# Altium footprint library PHOENIX THD.PcbLib: 109 footprints (part 3 of 8)
Each footprint in its own frame and in the unit in brackets; x right, y up, seen from the top. Pads: shape width x height; smd on the part's side, far side on the other; paste and mask are expansions set on the pad; w line width, h text height; cw(c..) or ccw(c..) is an arc to the next point about the centre after c.
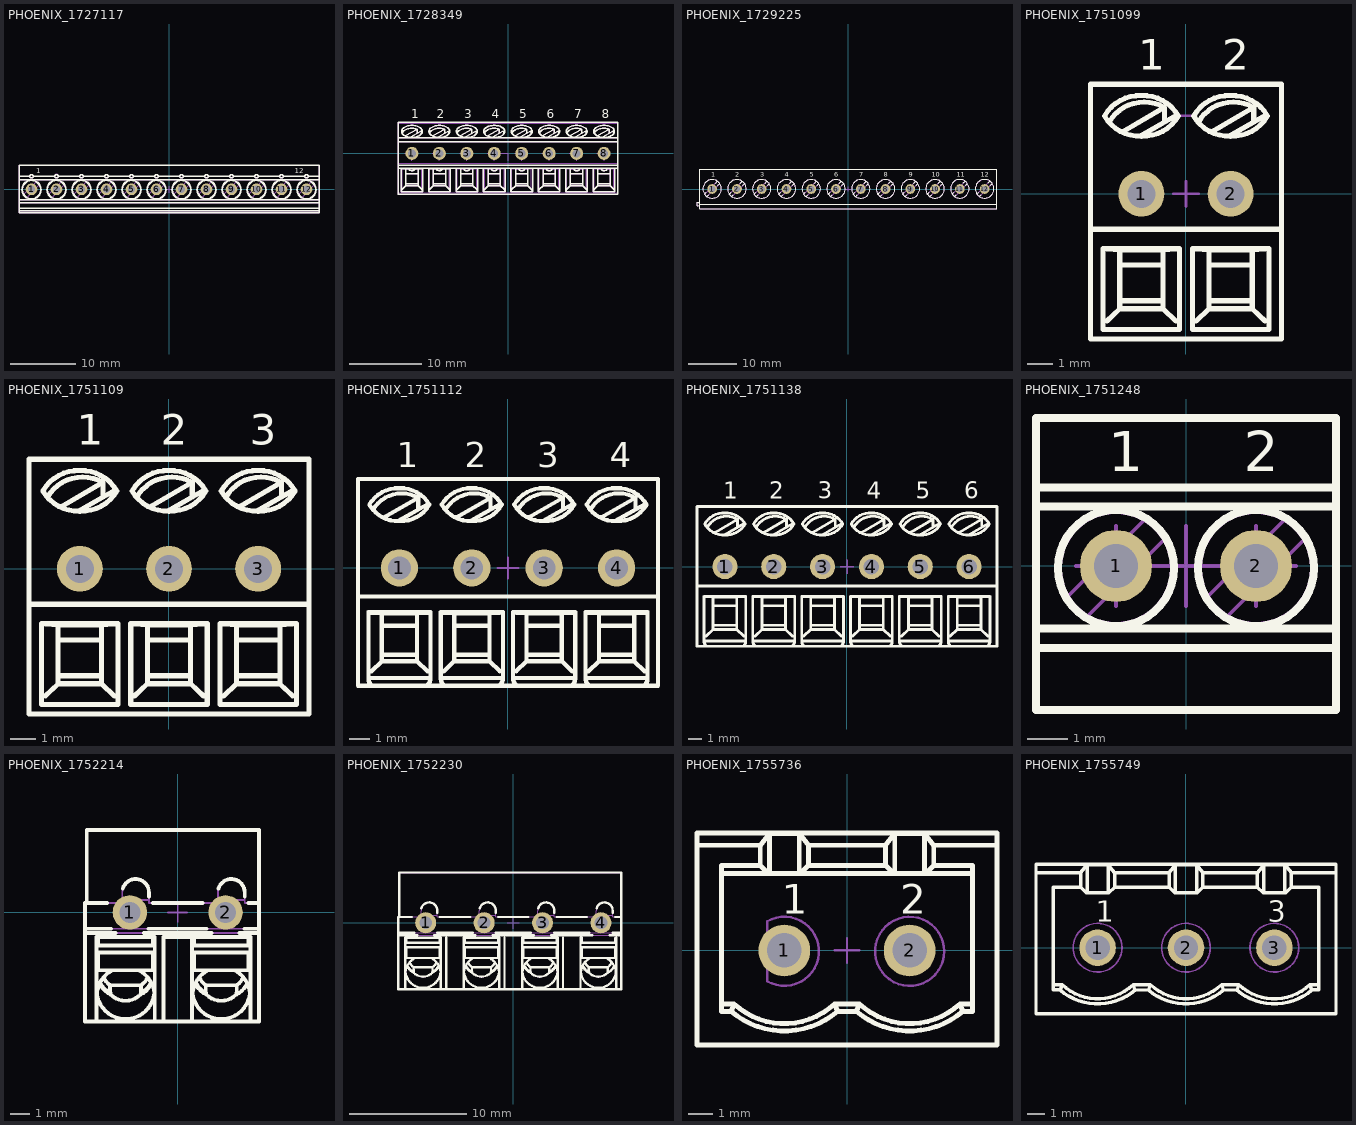
[diagram p2: the footprints below, top view; thin cyan lines are the x and y axes]

## PHOENIX_1727117 [mm] "PCB Terminal Block, Pitch 3.81mm, 12 Positions, Screw Connection"
height 8.5
pads (12):
  round 1.8 hole 1.1: 1(-20.955,0) 2(-17.145,0) 3(-13.335,0) 4(-9.525,0) 5(-5.715,0) 6(-1.905,0) 7(1.905,0) 8(5.715,0) 9(9.525,0) 10(13.335,0) 11(17.145,0) 12(20.955,0)
Top Overlay:
  circle w0.2: c-20.955,-0.05 r1.45
  circle w0.2: c-20.955,-0.05 r1.4
  circle w0.2: c-17.145,-0.05 r1.45
  circle w0.2: c-17.145,-0.05 r1.4
  circle w0.2: c-13.335,-0.05 r1.45
  circle w0.2: c-13.335,-0.05 r1.4
  circle w0.2: c-9.525,-0.05 r1.45
  circle w0.2: c-9.525,-0.05 r1.4
  circle w0.2: c-5.715,-0.05 r1.45
  circle w0.2: c-5.715,-0.05 r1.4
  circle w0.2: c-1.905,-0.05 r1.45
  circle w0.2: c-1.905,-0.05 r1.4
  circle w0.2: c1.905,-0.05 r1.45
  circle w0.2: c1.905,-0.05 r1.4
  circle w0.2: c5.715,-0.05 r1.45
  circle w0.2: c5.715,-0.05 r1.4
  circle w0.2: c9.525,-0.05 r1.45
  circle w0.2: c9.525,-0.05 r1.4
  circle w0.2: c13.335,-0.05 r1.45
  circle w0.2: c13.335,-0.05 r1.4
  circle w0.2: c17.145,-0.05 r1.45
  circle w0.2: c17.145,-0.05 r1.4
  circle w0.2: c20.955,-0.05 r1.45
  circle w0.2: c20.955,-0.05 r1.4
  lines w0.2: -22.86,-3.3 22.86,-3.3 ; -22.86,-2.861 22.86,-2.861 ; -22.86,-2.049 22.86,-2.049 ; -22.86,-1.566 22.86,-1.566 ; -22.86,1.487 22.86,1.487 ; -22.86,1.962 -21.254,1.962 ; -22.161,-0.761 -22.088,-0.688 ; -21.666,-1.256 -21.593,-1.183 ; -20.317,1.083 -20.244,1.156 ; -19.822,0.588 -19.749,0.661 ; -18.351,-0.761 -18.278,-0.688 ; -17.856,-1.256 -17.783,-1.183 ; -16.507,1.083 -16.434,1.156 ; -16.012,0.588 -15.939,0.661 ; -14.541,-0.761 -14.468,-0.688 ; -14.046,-1.256 -13.973,-1.183 ; -12.697,1.083 -12.624,1.156 ; -12.202,0.588 -12.129,0.661 ; -10.731,-0.761 -10.658,-0.688 ; -10.236,-1.256 -10.163,-1.183 ; -8.887,1.083 -8.814,1.156 ; -8.392,0.588 -8.319,0.661 ; -6.921,-0.761 -6.848,-0.688 ; -6.426,-1.256 -6.353,-1.183 ; -5.077,1.083 -5.004,1.156 ; -4.582,0.588 -4.509,0.661 ; -3.111,-0.761 -3.038,-0.688 ; -2.616,-1.256 -2.543,-1.183 ; -1.267,1.083 -1.194,1.156 ; -0.772,0.588 -0.699,0.661 ; 0.699,-0.761 0.772,-0.688 ; 1.194,-1.256 1.267,-1.183 ; 2.543,1.083 2.616,1.156 ; 3.038,0.588 3.111,0.661 ; 4.509,-0.761 4.582,-0.688 ; 5.004,-1.256 5.077,-1.183 ; 6.353,1.083 6.426,1.156 ; 6.848,0.588 6.921,0.661 ; 8.319,-0.761 8.392,-0.688 ; 8.814,-1.256 8.887,-1.183 ; 10.163,1.083 10.236,1.156 ; 10.658,0.588 10.731,0.661 ; 12.129,-0.761 12.202,-0.688 ; 12.624,-1.256 12.697,-1.183 ; 13.973,1.083 14.046,1.156 ; 14.468,0.588 14.541,0.661 ; 15.939,-0.761 16.012,-0.688 ; 16.434,-1.256 16.507,-1.183 ; 17.783,1.083 17.856,1.156 ; 18.278,0.588 18.351,0.661 ; 19.749,-0.761 19.822,-0.688 ; 20.244,-1.256 20.317,-1.183 ; 21.593,1.083 21.666,1.156 ; 22.088,0.588 22.161,0.661 ; 22.86,1.962 21.254,1.962 ; -21.254,1.962 ccw(c-20.955,2.065) -20.656,1.962 ; -21.254,1.962 cw(c-20.955,1.951) -20.656,1.962 ; -20.656,1.962 -17.444,1.962 ; -17.444,1.962 ccw(c-17.145,2.065) -16.846,1.962 ; -17.444,1.962 cw(c-17.145,1.951) -16.846,1.962 ; -16.846,1.962 -13.634,1.962 ; -13.634,1.962 ccw(c-13.335,2.065) -13.036,1.962 ; -13.634,1.962 cw(c-13.335,1.951) -13.036,1.962 ; -13.036,1.962 -9.824,1.962 ; -9.824,1.962 ccw(c-9.525,2.065) -9.226,1.962 ; -9.824,1.962 cw(c-9.525,1.951) -9.226,1.962 ; -9.226,1.962 -6.014,1.962 ; -6.014,1.962 ccw(c-5.715,2.065) -5.416,1.962 ; -6.014,1.962 cw(c-5.715,1.951) -5.416,1.962 ; -5.416,1.962 -2.204,1.962 ; -2.204,1.962 ccw(c-1.905,2.065) -1.606,1.962 ; -2.204,1.962 cw(c-1.905,1.951) -1.606,1.962 ; -1.606,1.962 1.606,1.962 ; 1.606,1.962 ccw(c1.905,2.065) 2.204,1.962 ; 1.606,1.962 cw(c1.905,1.951) 2.204,1.962 ; 2.204,1.962 5.416,1.962 ; 5.416,1.962 ccw(c5.715,2.065) 6.014,1.962 ; 5.416,1.962 cw(c5.715,1.951) 6.014,1.962 ; 6.014,1.962 9.226,1.962 ; 9.226,1.962 ccw(c9.525,2.065) 9.824,1.962 ; 9.226,1.962 cw(c9.525,1.951) 9.824,1.962 ; 9.824,1.962 13.036,1.962 ; 13.036,1.962 ccw(c13.335,2.065) 13.634,1.962 ; 13.036,1.962 cw(c13.335,1.951) 13.634,1.962 ; 13.634,1.962 16.846,1.962 ; 16.846,1.962 ccw(c17.145,2.065) 17.444,1.962 ; 16.846,1.962 cw(c17.145,1.951) 17.444,1.962 ; 17.444,1.962 20.656,1.962 ; 20.656,1.962 ccw(c20.955,2.065) 21.254,1.962 ; 20.656,1.962 cw(c20.955,1.951) 21.254,1.962 ; -22.86,-3.6 22.86,-3.6 22.86,3.7 -22.86,3.7 -22.86,-3.6
  text "1" at -20.215,2.425 h0.8
  text "12" at 19.195,2.45 h0.8
Mechanical 8:
  lines w0.1: -21.455,0 -20.955,0 ; -20.955,-0.5 -20.955,0 ; -20.955,0.5 -20.955,0 ; -20.455,0 -20.955,0 ; -17.645,0 -17.145,0 ; -17.145,-0.5 -17.145,0 ; -17.145,0.5 -17.145,0 ; -16.645,0 -17.145,0 ; -13.835,0 -13.335,0 ; -13.335,-0.5 -13.335,0 ; -13.335,0.5 -13.335,0 ; -12.835,0 -13.335,0 ; -10.025,0 -9.525,0 ; -9.525,-0.5 -9.525,0 ; -9.525,0.5 -9.525,0 ; -9.025,0 -9.525,0 ; -6.215,0 -5.715,0 ; -5.715,-0.5 -5.715,0 ; -5.715,0.5 -5.715,0 ; -5.215,0 -5.715,0 ; -2.405,0 -1.905,0 ; -1.905,-0.5 -1.905,0 ; -1.905,0.5 -1.905,0 ; -1.405,0 -1.905,0 ; -0.5,0 0,0 ; 0,-0.5 0,0 ; 0,0.5 0,0 ; 0.5,0 0,0 ; 1.405,0 1.905,0 ; 1.905,-0.5 1.905,0 ; 1.905,0.5 1.905,0 ; 2.405,0 1.905,0 ; 5.215,0 5.715,0 ; 5.715,-0.5 5.715,0 ; 5.715,0.5 5.715,0 ; 6.215,0 5.715,0 ; 9.025,0 9.525,0 ; 9.525,-0.5 9.525,0 ; 9.525,0.5 9.525,0 ; 10.025,0 9.525,0 ; 12.835,0 13.335,0 ; 13.335,-0.5 13.335,0 ; 13.335,0.5 13.335,0 ; 13.835,0 13.335,0 ; 16.645,0 17.145,0 ; 17.145,-0.5 17.145,0 ; 17.145,0.5 17.145,0 ; 17.645,0 17.145,0 ; 20.455,0 20.955,0 ; 20.955,-0.5 20.955,0 ; 20.955,0.5 20.955,0 ; 21.455,0 20.955,0
Mechanical 14:
  circle w0.1: c-20.955,-0.05 r1.45
  circle w0.1: c-20.955,-0.05 r1.4
  circle w0.1: c-17.145,-0.05 r1.45
  circle w0.1: c-17.145,-0.05 r1.4
  circle w0.1: c-13.335,-0.05 r1.45
  circle w0.1: c-13.335,-0.05 r1.4
  circle w0.1: c-9.525,-0.05 r1.45
  circle w0.1: c-9.525,-0.05 r1.4
  circle w0.1: c-5.715,-0.05 r1.45
  circle w0.1: c-5.715,-0.05 r1.4
  circle w0.1: c-1.905,-0.05 r1.45
  circle w0.1: c-1.905,-0.05 r1.4
  circle w0.1: c1.905,-0.05 r1.45
  circle w0.1: c1.905,-0.05 r1.4
  circle w0.1: c5.715,-0.05 r1.45
  circle w0.1: c5.715,-0.05 r1.4
  circle w0.1: c9.525,-0.05 r1.45
  circle w0.1: c9.525,-0.05 r1.4
  circle w0.1: c13.335,-0.05 r1.45
  circle w0.1: c13.335,-0.05 r1.4
  circle w0.1: c17.145,-0.05 r1.45
  circle w0.1: c17.145,-0.05 r1.4
  circle w0.1: c20.955,-0.05 r1.45
  circle w0.1: c20.955,-0.05 r1.4
  lines w0.1: -22.86,-3.3 22.86,-3.3 ; -22.86,-2.861 22.86,-2.861 ; -22.86,-2.049 22.86,-2.049 ; -22.86,-1.566 22.86,-1.566 ; -22.86,1.487 22.86,1.487 ; -22.86,1.962 -21.254,1.962 ; -22.161,-0.761 -20.244,1.156 ; -21.666,-1.256 -19.749,0.661 ; -20.656,2.012 -17.444,2.012 cw(c-17.145,2.001) -16.846,2.012 -13.634,2.012 ; -18.351,-0.761 -16.434,1.156 ; -17.856,-1.256 -15.939,0.661 ; -14.541,-0.761 -12.624,1.156 ; -14.046,-1.256 -12.129,0.661 ; -10.731,-0.761 -8.814,1.156 ; -10.236,-1.256 -8.319,0.661 ; -6.921,-0.761 -5.004,1.156 ; -6.426,-1.256 -4.509,0.661 ; -3.111,-0.761 -1.194,1.156 ; -2.616,-1.256 -0.699,0.661 ; 0.699,-0.761 2.616,1.156 ; 1.194,-1.256 3.111,0.661 ; 4.509,-0.761 6.426,1.156 ; 5.004,-1.256 6.921,0.661 ; 8.319,-0.761 10.236,1.156 ; 8.814,-1.256 10.731,0.661 ; 12.129,-0.761 14.046,1.156 ; 12.624,-1.256 14.541,0.661 ; 15.939,-0.761 17.856,1.156 ; 16.434,-1.256 18.351,0.661 ; 19.749,-0.761 21.666,1.156 ; 20.244,-1.256 22.161,0.661 ; 22.86,1.962 21.254,1.962 ; -21.254,1.962 ccw(c-20.955,2.065) -20.656,1.962 ; -21.254,1.962 cw(c-20.955,1.951) -20.656,1.962 ; -20.656,1.962 -17.444,1.962 ; -17.444,1.962 ccw(c-17.145,2.065) -16.846,1.962 ; -17.444,1.962 cw(c-17.145,1.951) -16.846,1.962 ; -16.846,1.962 -13.634,1.962 ; -13.634,1.962 ccw(c-13.335,2.065) -13.036,1.962 ; -13.634,1.962 cw(c-13.335,1.951) -13.036,1.962 ; -13.036,1.962 -9.824,1.962 ; -9.824,1.962 ccw(c-9.525,2.065) -9.226,1.962 ; -9.824,1.962 cw(c-9.525,1.951) -9.226,1.962 ; -9.226,1.962 -6.014,1.962 ; -6.014,1.962 ccw(c-5.715,2.065) -5.416,1.962 ; -6.014,1.962 cw(c-5.715,1.951) -5.416,1.962 ; -5.416,1.962 -2.204,1.962 ; -2.204,1.962 ccw(c-1.905,2.065) -1.606,1.962 ; -2.204,1.962 cw(c-1.905,1.951) -1.606,1.962 ; -1.606,1.962 1.606,1.962 ; 1.606,1.962 ccw(c1.905,2.065) 2.204,1.962 ; 1.606,1.962 cw(c1.905,1.951) 2.204,1.962 ; 2.204,1.962 5.416,1.962 ; 5.416,1.962 ccw(c5.715,2.065) 6.014,1.962 ; 5.416,1.962 cw(c5.715,1.951) 6.014,1.962 ; 6.014,1.962 9.226,1.962 ; 9.226,1.962 ccw(c9.525,2.065) 9.824,1.962 ; 9.226,1.962 cw(c9.525,1.951) 9.824,1.962 ; 9.824,1.962 13.036,1.962 ; 13.036,1.962 ccw(c13.335,2.065) 13.634,1.962 ; 13.036,1.962 cw(c13.335,1.951) 13.634,1.962 ; 13.634,1.962 16.846,1.962 ; 16.846,1.962 ccw(c17.145,2.065) 17.444,1.962 ; 16.846,1.962 cw(c17.145,1.951) 17.444,1.962 ; 17.444,1.962 20.656,1.962 ; 20.656,1.962 ccw(c20.955,2.065) 21.254,1.962 ; 20.656,1.962 cw(c20.955,1.951) 21.254,1.962 ; -22.86,-3.6 22.86,-3.6 22.86,3.7 -22.86,3.7 -22.86,-3.6
  text "1" at -20.215,2.425 h0.8
  text "12" at 19.195,2.45 h0.8
3D body "PHOENIX_1727117.stp": height 8.5, standoff -3.5, extent -22.86,-3.6 22.86,3.7

## PHOENIX_1728349 [mm] "PC Terminal Block, Pitch 3.81mm, 8 Positions, Screw Connection"
height 9.5
pads (8):
  round 1.8 hole 1.1: 1(-13.335,0) 2(-9.525,0) 3(-5.715,0) 4(-1.905,0) 5(1.905,0) 6(5.715,0) 7(9.525,0) 8(13.335,0)
Top Overlay:
  drawing of 612 lines, arcs and shapes, not listed
  text "8" at 13.002,4.875 h1.2
  text "7" at 9.192,4.875 h1.2
  text "6" at 5.405,4.875 h1.2
  text "5" at 1.572,4.875 h1.2
  text "4" at -2.262,4.875 h1.2
  text "3" at -6.048,4.875 h1.2
  text "2" at -9.858,4.875 h1.2
  text "1" at -13.454,4.875 h1.2
Mechanical 1:
  text "1" at -13.454,4.875 h1.2
  text "2" at -9.858,4.875 h1.2
  text "3" at -6.048,4.875 h1.2
  text "4" at -2.262,4.875 h1.2
  text "5" at 1.572,4.875 h1.2
  text "6" at 5.406,4.875 h1.2
  text "7" at 9.192,4.875 h1.2
  text "8" at 13.002,4.875 h1.2
Mechanical 8:
  lines w0.1: -14.335,0 -13.335,0 -13.335,-1 ; -10.525,0 -9.525,0 -9.525,-1 ; -6.715,0 -5.715,0 -5.715,-1 ; -2.905,0 -1.905,0 -1.905,-1 ; -1,0 0,0 0,-1 ; 0.905,0 1.905,0 1.905,-1 ; 4.715,0 5.715,0 5.715,-1 ; 8.525,0 9.525,0 9.525,-1 ; 12.335,0 13.335,0 13.335,-1 ; -13.335,-0.55 cw(c-13.335,0) -13.335,0.55 cw(c-13.335,0) -13.335,-0.55 ; -9.525,-0.55 cw(c-9.525,0) -9.525,0.55 cw(c-9.525,0) -9.525,-0.55 ; -5.715,-0.55 cw(c-5.715,0) -5.715,0.55 cw(c-5.715,0) -5.715,-0.55 ; -1.905,-0.55 ccw(c-1.905,0) -1.905,0.55 ccw(c-1.905,0) -1.905,-0.55 ; 1.905,-0.55 ccw(c1.905,0) 1.905,0.55 ccw(c1.905,0) 1.905,-0.55 ; 5.715,-0.55 cw(c5.715,0) 5.715,0.55 cw(c5.715,0) 5.715,-0.55 ; 9.525,-0.55 ccw(c9.525,0) 9.525,0.55 ccw(c9.525,0) 9.525,-0.55 ; 13.335,-0.55 cw(c13.335,0) 13.335,0.55 cw(c13.335,0) 13.335,-0.55
Mechanical 14:
  drawing of 915 lines, arcs and shapes, not listed
3D body "PHOENIX_1728349.stp": height 9.5, standoff -3.5, extent -15.24,-5.7 15.24,4.3

## PHOENIX_1729225 [mm] "Terminal Block, 13.5A 400V, Pitch 5.08mm, 12 Positions, Screw Connection"
height 10
pads (12):
  round 2 hole 1.3: 1(-27.94,0) 2(-22.86,0) 3(-17.78,0) 4(-12.7,0) 5(-7.62,0) 6(-2.54,0) 7(2.54,0) 8(7.62,0) 9(12.7,0) 10(17.78,0) 11(22.86,0) 12(27.94,0)
Top Overlay:
  circle w0.2: c27.94,0.05 r1.9
  circle w0.2: c22.86,0.05 r1.9
  circle w0.2: c17.78,0.025 r1.9
  circle w0.2: c12.7,0.025 r1.9
  circle w0.2: c7.62,0.025 r1.9
  circle w0.2: c2.54,0.025 r1.9
  circle w0.2: c-2.54,0.025 r1.9
  circle w0.2: c-7.62,0.025 r1.9
  circle w0.2: c-12.7,0.025 r1.9
  circle w0.2: c-17.78,0.025 r1.9
  circle w0.2: c-22.86,0.025 r1.9
  circle w0.2: c-27.94,0.025 r1.9
  lines w0.2: -30.48,-3.327 -30.609,-3.327 -30.787,-3.477 -31.05,-3.477 -31.05,-2.763 -30.787,-2.763 -30.609,-2.913 -30.48,-2.913 ; -30.48,-3.128 30.48,-3.128 ; -29.508,-1.048 -29.155,-0.695 ; -29.013,-1.543 -28.667,-1.197 ; -27.245,1.215 -26.867,1.593 ; -26.743,0.727 -26.372,1.098 ; -24.428,-1.048 -24.075,-0.695 ; -23.933,-1.543 -23.587,-1.197 ; -22.165,1.215 -21.787,1.593 ; -21.663,0.727 -21.292,1.098 ; -19.348,-1.048 -18.995,-0.695 ; -18.853,-1.543 -18.507,-1.197 ; -17.085,1.215 -16.707,1.593 ; -16.583,0.727 -16.212,1.098 ; -14.268,-1.048 -13.915,-0.695 ; -13.773,-1.543 -13.427,-1.197 ; -12.005,1.215 -11.627,1.593 ; -11.503,0.727 -11.132,1.098 ; -9.188,-1.048 -8.835,-0.695 ; -8.693,-1.543 -8.347,-1.197 ; -6.925,1.215 -6.547,1.593 ; -6.423,0.727 -6.052,1.098 ; -4.108,-1.048 -3.755,-0.695 ; -3.613,-1.543 -3.267,-1.197 ; -1.845,1.215 -1.467,1.593 ; -1.343,0.727 -0.972,1.098 ; 0.972,-1.048 1.325,-0.695 ; 1.467,-1.543 1.813,-1.197 ; 3.235,1.215 3.613,1.593 ; 3.737,0.727 4.108,1.098 ; 6.052,-1.048 6.405,-0.695 ; 6.547,-1.543 6.893,-1.197 ; 8.315,1.215 8.693,1.593 ; 8.817,0.727 9.188,1.098 ; 11.132,-1.048 11.485,-0.695 ; 11.627,-1.543 11.973,-1.197 ; 13.395,1.215 13.773,1.593 ; 13.897,0.727 14.268,1.098 ; 16.212,-1.048 16.565,-0.695 ; 16.707,-1.543 17.053,-1.197 ; 18.475,1.215 18.853,1.593 ; 18.977,0.727 19.348,1.098 ; 21.292,-1.023 21.645,-0.67 ; 21.787,-1.518 22.133,-1.172 ; 23.555,1.24 23.933,1.618 ; 24.057,0.752 24.428,1.123 ; 26.372,-1.023 26.725,-0.67 ; 26.867,-1.518 27.213,-1.172 ; 28.635,1.24 29.013,1.618 ; 29.137,0.752 29.508,1.123 ; -30.48,-4.05 -30.48,4.05 30.48,4.05 30.48,-4.05 -30.48,-4.05
  text "8" at 7.303,2.508 h1
  text "7" at 2.223,2.508 h1
  text "6" at -2.857,2.508 h1
  text "5" at -7.937,2.508 h1
  text "4" at -13.017,2.508 h1
  text "3" at -18.097,2.508 h1
  text "2" at -23.177,2.508 h1
  text "1" at -28.099,2.508 h1
  text "9" at 12.383,2.508 h1
  text "10" at 17.145,2.508 h1
  text "11" at 22.225,2.508 h1
  text "12" at 27.146,2.508 h1
Mechanical 8:
  lines w0.1: -28.44,0 -27.94,0 ; -27.94,-0.5 -27.94,0 ; -27.94,0.5 -27.94,0 ; -27.44,0 -27.94,0 ; -23.36,0 -22.86,0 ; -22.86,-0.5 -22.86,0 ; -22.86,0.5 -22.86,0 ; -22.36,0 -22.86,0 ; -18.28,0 -17.78,0 ; -17.78,-0.5 -17.78,0 ; -17.78,0.5 -17.78,0 ; -17.28,0 -17.78,0 ; -13.2,0 -12.7,0 ; -12.7,-0.5 -12.7,0 ; -12.7,0.5 -12.7,0 ; -12.2,0 -12.7,0 ; -8.12,0 -7.62,0 ; -7.62,-0.5 -7.62,0 ; -7.62,0.5 -7.62,0 ; -7.12,0 -7.62,0 ; -3.04,0 -2.54,0 ; -2.54,-0.5 -2.54,0 ; -2.54,0.5 -2.54,0 ; -2.04,0 -2.54,0 ; -0.5,0 0,0 ; 0,-0.5 0,0 ; 0,0.5 0,0 ; 0.5,0 0,0 ; 2.04,0 2.54,0 ; 2.54,-0.5 2.54,0 ; 2.54,0.5 2.54,0 ; 3.04,0 2.54,0 ; 7.12,0 7.62,0 ; 7.62,-0.5 7.62,0 ; 7.62,0.5 7.62,0 ; 8.12,0 7.62,0 ; 12.2,0 12.7,0 ; 12.7,-0.5 12.7,0 ; 12.7,0.5 12.7,0 ; 13.2,0 12.7,0 ; 17.28,0 17.78,0 ; 17.78,-0.5 17.78,0 ; 17.78,0.5 17.78,0 ; 18.28,0 17.78,0 ; 22.36,0.025 22.86,0.025 ; 22.86,-0.475 22.86,0.025 ; 22.86,0.525 22.86,0.025 ; 23.36,0.025 22.86,0.025 ; 27.44,0.025 27.94,0.025 ; 27.94,-0.475 27.94,0.025 ; 27.94,0.525 27.94,0.025 ; 28.44,0.025 27.94,0.025
Mechanical 14:
  circle w0.1: c27.94,0.025 r1.9
  circle w0.1: c22.86,0.025 r1.9
  circle w0.1: c17.78,0.025 r1.9
  circle w0.1: c12.7,0.025 r1.9
  circle w0.1: c7.62,0.025 r1.9
  circle w0.1: c2.54,0.025 r1.9
  circle w0.1: c-2.54,0.025 r1.9
  circle w0.1: c-7.62,0.025 r1.9
  circle w0.1: c-12.7,0.025 r1.9
  circle w0.1: c-17.78,0.025 r1.9
  circle w0.1: c-22.86,0.025 r1.9
  circle w0.1: c-27.94,0.025 r1.9
  lines w0.1: -30.48,-3.327 -30.609,-3.327 -30.787,-3.477 -31.05,-3.477 -31.05,-2.763 -30.787,-2.763 -30.609,-2.913 -30.48,-2.913 ; -30.48,-3.128 30.48,-3.128 ; -29.508,-1.048 -26.867,1.593 ; -29.013,-1.543 -26.372,1.098 ; -24.428,-1.048 -21.787,1.593 ; -23.933,-1.543 -21.292,1.098 ; -19.348,-1.048 -16.707,1.593 ; -18.853,-1.543 -16.212,1.098 ; -14.268,-1.048 -11.627,1.593 ; -13.773,-1.543 -11.132,1.098 ; -9.188,-1.048 -6.547,1.593 ; -8.693,-1.543 -6.052,1.098 ; -4.108,-1.048 -1.467,1.593 ; -3.613,-1.543 -0.972,1.098 ; 0.972,-1.048 3.613,1.593 ; 1.467,-1.543 4.108,1.098 ; 6.052,-1.048 8.693,1.593 ; 6.547,-1.543 9.188,1.098 ; 11.132,-1.048 13.773,1.593 ; 11.627,-1.543 14.268,1.098 ; 16.212,-1.048 18.853,1.593 ; 16.707,-1.543 19.348,1.098 ; 21.292,-1.048 23.933,1.593 ; 21.787,-1.543 24.428,1.098 ; 26.372,-1.048 29.013,1.593 ; 26.867,-1.543 29.508,1.098 ; -30.48,-4.05 -30.48,4.05 30.48,4.05 30.48,-4.05 -30.48,-4.05
  text "8" at 7.303,2.508 h1
  text "7" at 2.223,2.508 h1
  text "6" at -2.857,2.508 h1
  text "5" at -7.937,2.508 h1
  text "4" at -13.017,2.508 h1
  text "3" at -18.097,2.508 h1
  text "2" at -23.177,2.508 h1
  text "1" at -28.099,2.508 h1
  text "9" at 12.383,2.508 h1
  text "10" at 17.145,2.508 h1
  text "11" at 22.225,2.508 h1
  text "12" at 27.146,2.508 h1
3D body "PHOENIX_1729225.stp": height 10, standoff -3.5, extent -31.05,-4.05 30.48,4.05

## PHOENIX_1751099 [mm] "PC Terminal Block, Pitch 3.5mm, 2 Positions, Screw Connection"
height 9.5
pads (2):
  round 1.8 hole 1.1: 1(-1.75,0) 2(1.75,0)
Top Overlay:
  lines w0.2: -3.75,-1.391 3.75,-1.391 ; -3.104,-4.995 -2.6,-4.514 ; -3.104,-2.167 -2.6,-2.2 ; -3.021,2.805 cw(c-1.641,2.01) -0.839,3.387 ; -2.6,-4.199 -0.9,-4.199 ; -2.6,-2.8 -0.9,-2.8 ; -2.6,-2.201 -0.9,-2.201 ; -2.483,2.444 -0.839,3.387 ; -1.81,2.262 -0.344,3.103 ; -1.752,2.259 cw(c-1.819,3.851) -3.2,3.055 cw(c-1.819,2.26) -1.752,3.852 ; -1.748,2.259 ccw(c-1.681,3.851) -0.3,3.055 ccw(c-1.681,2.26) -1.748,3.852 ; -0.839,2.819 -0.839,3.387 ; -0.396,-4.995 -0.9,-4.514 ; -0.396,-2.167 -0.9,-2.2 ; 0.396,-4.995 0.9,-4.514 ; 0.396,-2.167 0.9,-2.2 ; 0.479,2.805 cw(c1.859,2.01) 2.661,3.387 ; 0.9,-4.199 2.6,-4.199 ; 0.9,-2.8 2.6,-2.8 ; 0.9,-2.201 2.6,-2.201 ; 1.017,2.444 2.661,3.387 ; 1.69,2.262 3.156,3.103 ; 1.748,2.259 cw(c1.681,3.851) 0.3,3.055 cw(c1.681,2.26) 1.748,3.852 ; 1.752,2.259 ccw(c1.819,3.851) 3.2,3.055 ccw(c1.819,2.26) 1.752,3.852 ; 2.661,2.819 2.661,3.387 ; 3.104,-4.995 2.6,-4.514 ; 3.104,-2.167 2.6,-2.2 ; -2.6,-4.514 -0.9,-4.514 ; -2.6,-4.514 -2.6,-2.2 ; -2.6,-2.2 -0.9,-2.2 ; -0.9,-4.514 -0.9,-2.2 ; 0.9,-4.514 2.6,-4.514 ; 0.9,-4.514 0.9,-2.2 ; 0.9,-2.2 2.6,-2.2 ; 2.6,-4.514 2.6,-2.2 ; -3.75,-5.7 -3.75,4.3 3.75,4.3 3.75,-5.7 -3.75,-5.7 ; -3.25,-5.326 -3.25,-2.144 -0.25,-2.144 -0.25,-5.326 -3.25,-5.326 ; 0.25,-5.326 3.25,-5.326 3.25,-2.144 0.25,-2.144 0.25,-5.326
  text "2" at 1.417,4.875 h1.2
  text "1" at -1.869,4.875 h1.2
Mechanical 8:
  lines w0.1: -2.25,0 -1.75,0 ; -1.75,-0.5 -1.75,0 ; -1.75,0.5 -1.75,0 ; -1.25,0 -1.75,0 ; -0.5,0 0,0 ; 0,-0.5 0,0 ; 0,0.5 0,0 ; 0.5,0 0,0 ; 1.25,0 1.75,0 ; 1.75,-0.5 1.75,0 ; 1.75,0.5 1.75,0 ; 2.25,0 1.75,0
Mechanical 14:
  lines w0.1: -3.75,-1.391 3.75,-1.391 ; -3.104,-4.995 -2.6,-4.514 ; -3.104,-2.167 -2.6,-2.2 ; -3.021,2.805 cw(c-1.641,2.01) -0.839,3.387 ; -2.6,-4.199 -0.9,-4.199 ; -2.6,-2.8 -0.9,-2.8 ; -2.6,-2.201 -0.9,-2.201 ; -2.483,2.444 -0.839,3.387 ; -1.81,2.262 -0.344,3.103 ; -1.752,2.259 cw(c-1.819,3.851) -3.2,3.055 cw(c-1.819,2.26) -1.752,3.852 ; -1.748,2.259 ccw(c-1.681,3.851) -0.3,3.055 ; -1.748,3.852 cw(c-1.681,2.26) -0.3,3.055 ; -0.839,2.819 -0.839,3.387 ; -0.396,-4.995 -0.9,-4.514 ; -0.396,-2.167 -0.9,-2.2 ; 0.396,-4.995 0.9,-4.514 ; 0.396,-2.167 0.9,-2.2 ; 0.479,2.805 cw(c1.859,2.01) 2.661,3.387 ; 0.9,-4.199 2.6,-4.199 ; 0.9,-2.8 2.6,-2.8 ; 0.9,-2.201 2.6,-2.201 ; 1.017,2.444 2.661,3.387 ; 1.69,2.262 3.156,3.103 ; 1.748,2.259 cw(c1.681,3.851) 0.3,3.055 ; 1.748,3.852 ccw(c1.681,2.26) 0.3,3.055 ; 1.752,2.259 ccw(c1.819,3.851) 3.2,3.055 ccw(c1.819,2.26) 1.752,3.852 ; 2.661,2.819 2.661,3.387 ; 3.104,-4.995 2.6,-4.514 ; 3.104,-2.167 2.6,-2.2 ; -2.6,-4.514 -0.9,-4.514 ; -2.6,-4.514 -2.6,-2.2 ; -2.6,-2.2 -0.9,-2.2 ; -0.9,-4.514 -0.9,-2.2 ; -0.3,3.055 0.3,3.055 ; 0.9,-4.514 2.6,-4.514 ; 0.9,-4.514 0.9,-2.2 ; 0.9,-2.2 2.6,-2.2 ; 2.6,-4.514 2.6,-2.2 ; -3.75,-5.7 -3.75,4.3 3.75,4.3 3.75,-5.7 -3.75,-5.7 ; -3.25,-5.326 -3.25,-2.144 -0.25,-2.144 -0.25,-5.326 -3.25,-5.326 ; 0.25,-5.326 3.25,-5.326 3.25,-2.144 0.25,-2.144 0.25,-5.326
  text "1" at -1.869,4.875 h1.2
  text "2" at 1.417,4.875 h1.2
3D body "PHOENIX_1751099.stp": height 9.5, standoff -3.5, extent -3.75,-5.7 3.75,4.3

## PHOENIX_1751109 [mm] "PC Terminal Block, Pitch 3.5mm, 3 Positions, Screw Connection"
height 9.5
pads (3):
  round 1.8 hole 1.1: 1(-3.5,0) 2(0,0) 3(3.5,0)
Top Overlay:
  lines w0.2: -5.5,-1.391 5.5,-1.391 ; -4.854,-4.995 -4.35,-4.514 ; -4.854,-2.167 -4.35,-2.2 ; -4.771,2.805 cw(c-3.391,2.01) -2.589,3.387 ; -4.35,-4.199 -2.65,-4.199 ; -4.35,-2.8 -2.65,-2.8 ; -4.35,-2.201 -2.65,-2.201 ; -4.233,2.444 -2.589,3.387 ; -3.56,2.262 -2.094,3.103 ; -3.502,2.259 cw(c-3.569,3.851) -4.95,3.055 cw(c-3.569,2.26) -3.502,3.852 ; -3.498,2.259 ccw(c-3.431,3.851) -2.05,3.055 ccw(c-3.431,2.26) -3.498,3.852 ; -2.589,2.819 -2.589,3.387 ; -2.146,-4.995 -2.65,-4.514 ; -2.146,-2.167 -2.65,-2.2 ; -1.354,-4.995 -0.85,-4.514 ; -1.354,-2.167 -0.85,-2.2 ; -1.271,2.805 cw(c0.109,2.01) 0.911,3.387 ; -0.85,-4.199 0.85,-4.199 ; -0.85,-2.8 0.85,-2.8 ; -0.85,-2.201 0.85,-2.201 ; -0.733,2.444 0.911,3.387 ; -0.06,2.262 1.406,3.103 ; -0.002,2.259 cw(c-0.069,3.851) -1.45,3.055 cw(c-0.069,2.26) -0.002,3.852 ; 0.002,2.259 ccw(c0.069,3.851) 1.45,3.055 ccw(c0.069,2.26) 0.002,3.852 ; 0.911,2.819 0.911,3.387 ; 1.354,-4.995 0.85,-4.514 ; 1.354,-2.167 0.85,-2.2 ; 2.146,-4.995 2.65,-4.514 ; 2.146,-2.167 2.65,-2.2 ; 2.229,2.805 cw(c3.609,2.01) 4.411,3.387 ; 2.65,-4.199 4.35,-4.199 ; 2.65,-2.8 4.35,-2.8 ; 2.65,-2.201 4.35,-2.201 ; 2.767,2.444 4.411,3.387 ; 3.44,2.262 4.906,3.103 ; 3.498,2.259 cw(c3.431,3.851) 2.05,3.055 cw(c3.431,2.26) 3.498,3.852 ; 3.502,2.259 ccw(c3.569,3.851) 4.95,3.055 ccw(c3.569,2.26) 3.502,3.852 ; 4.411,2.819 4.411,3.387 ; 4.854,-4.995 4.35,-4.514 ; 4.854,-2.167 4.35,-2.2 ; 5.5,-5.326 5.5,-2.144 ; -4.35,-4.514 -2.65,-4.514 ; -4.35,-4.514 -4.35,-2.2 ; -4.35,-2.2 -2.65,-2.2 ; -2.65,-4.514 -2.65,-2.2 ; -0.85,-4.514 0.85,-4.514 ; -0.85,-4.514 -0.85,-2.2 ; -0.85,-2.2 0.85,-2.2 ; 0.85,-4.514 0.85,-2.2 ; 2.65,-4.514 4.35,-4.514 ; 2.65,-4.514 2.65,-2.2 ; 2.65,-2.2 4.35,-2.2 ; 4.35,-4.514 4.35,-2.2 ; -5.5,-5.7 5.5,-5.7 5.5,4.3 -5.5,4.3 -5.5,-5.7 ; -5,-5.326 -5,-2.144 -2,-2.144 -2,-5.326 -5,-5.326 ; -1.5,-5.326 -1.5,-2.144 1.5,-2.144 1.5,-5.326 -1.5,-5.326 ; 2,-5.326 5,-5.326 5,-2.144 2,-2.144 2,-5.326
  text "3" at 3.167,4.875 h1.2
  text "2" at -0.333,4.875 h1.2
  text "1" at -3.619,4.875 h1.2
Mechanical 8:
  lines w0.1: -4,0 -3.5,0 ; -3.5,-0.5 -3.5,0 ; -3.5,0.5 -3.5,0 ; -3,0 -3.5,0 ; -0.5,0 0,0 ; 0,-0.5 0,0 ; 0,0.5 0,0 ; 0.5,0 0,0 ; 3,0 3.5,0 ; 3.5,-0.5 3.5,0 ; 3.5,0.5 3.5,0 ; 4,0 3.5,0
Mechanical 14:
  lines w0.1: -5.5,-1.391 5.5,-1.391 ; -4.854,-4.995 -4.35,-4.514 ; -4.854,-2.167 -4.35,-2.2 ; -4.771,2.805 cw(c-3.391,2.01) -2.589,3.387 ; -4.35,-4.199 -2.65,-4.199 ; -4.35,-2.8 -2.65,-2.8 ; -4.35,-2.201 -2.65,-2.201 ; -4.233,2.444 -2.589,3.387 ; -3.56,2.262 -2.094,3.103 ; -3.502,2.259 cw(c-3.569,3.851) -4.95,3.055 cw(c-3.569,2.26) -3.502,3.852 ; -3.498,2.259 ccw(c-3.431,3.851) -2.05,3.055 ccw(c-3.431,2.26) -3.498,3.852 ; -2.589,2.819 -2.589,3.387 ; -2.146,-4.995 -2.65,-4.514 ; -2.146,-2.167 -2.65,-2.2 ; -1.354,-4.995 -0.85,-4.514 ; -1.354,-2.167 -0.85,-2.2 ; -1.271,2.805 cw(c0.109,2.01) 0.911,3.387 ; -0.85,-4.199 0.85,-4.199 ; -0.85,-2.8 0.85,-2.8 ; -0.85,-2.201 0.85,-2.201 ; -0.733,2.444 0.911,3.387 ; -0.06,2.262 1.406,3.103 ; -0.002,2.259 cw(c-0.069,3.851) -1.45,3.055 cw(c-0.069,2.26) -0.002,3.852 ; 0.002,2.259 ccw(c0.069,3.851) 1.45,3.055 ccw(c0.069,2.26) 0.002,3.852 ; 0.911,2.819 0.911,3.387 ; 1.354,-4.995 0.85,-4.514 ; 1.354,-2.167 0.85,-2.2 ; 2.146,-4.995 2.65,-4.514 ; 2.146,-2.167 2.65,-2.2 ; 2.229,2.805 cw(c3.609,2.01) 4.411,3.387 ; 2.65,-4.199 4.35,-4.199 ; 2.65,-2.8 4.35,-2.8 ; 2.65,-2.201 4.35,-2.201 ; 2.767,2.444 4.411,3.387 ; 3.44,2.262 4.906,3.103 ; 3.498,2.259 cw(c3.431,3.851) 2.05,3.055 cw(c3.431,2.26) 3.498,3.852 ; 3.502,2.259 ccw(c3.569,3.851) 4.95,3.055 ccw(c3.569,2.26) 3.502,3.852 ; 4.411,2.819 4.411,3.387 ; 4.854,-4.995 4.35,-4.514 ; 4.854,-2.167 4.35,-2.2 ; 5.5,-5.326 5.5,-2.144 ; -4.35,-4.514 -2.65,-4.514 ; -4.35,-4.514 -4.35,-2.2 ; -4.35,-2.2 -2.65,-2.2 ; -2.65,-4.514 -2.65,-2.2 ; -0.85,-4.514 0.85,-4.514 ; -0.85,-4.514 -0.85,-2.2 ; -0.85,-2.2 0.85,-2.2 ; 0.85,-4.514 0.85,-2.2 ; 2.65,-4.514 4.35,-4.514 ; 2.65,-4.514 2.65,-2.2 ; 2.65,-2.2 4.35,-2.2 ; 4.35,-4.514 4.35,-2.2 ; -5.5,-5.7 5.5,-5.7 5.5,4.3 -5.5,4.3 -5.5,-5.7 ; -5,-5.326 -5,-2.144 -2,-2.144 -2,-5.326 -5,-5.326 ; -1.5,-5.326 -1.5,-2.144 1.5,-2.144 1.5,-5.326 -1.5,-5.326 ; 2,-5.326 5,-5.326 5,-2.144 2,-2.144 2,-5.326